# Altium footprint library Shield_v31.PcbLib: 24 footprints (part 1 of 2)
Each footprint in its own frame and in the unit in brackets; x right, y up, seen from the top. Pads: shape width x height; smd on the part's side, far side on the other; paste and mask are expansions set on the pad; w line width, h text height; cw(c..) or ccw(c..) is an arc to the next point about the centre after c.
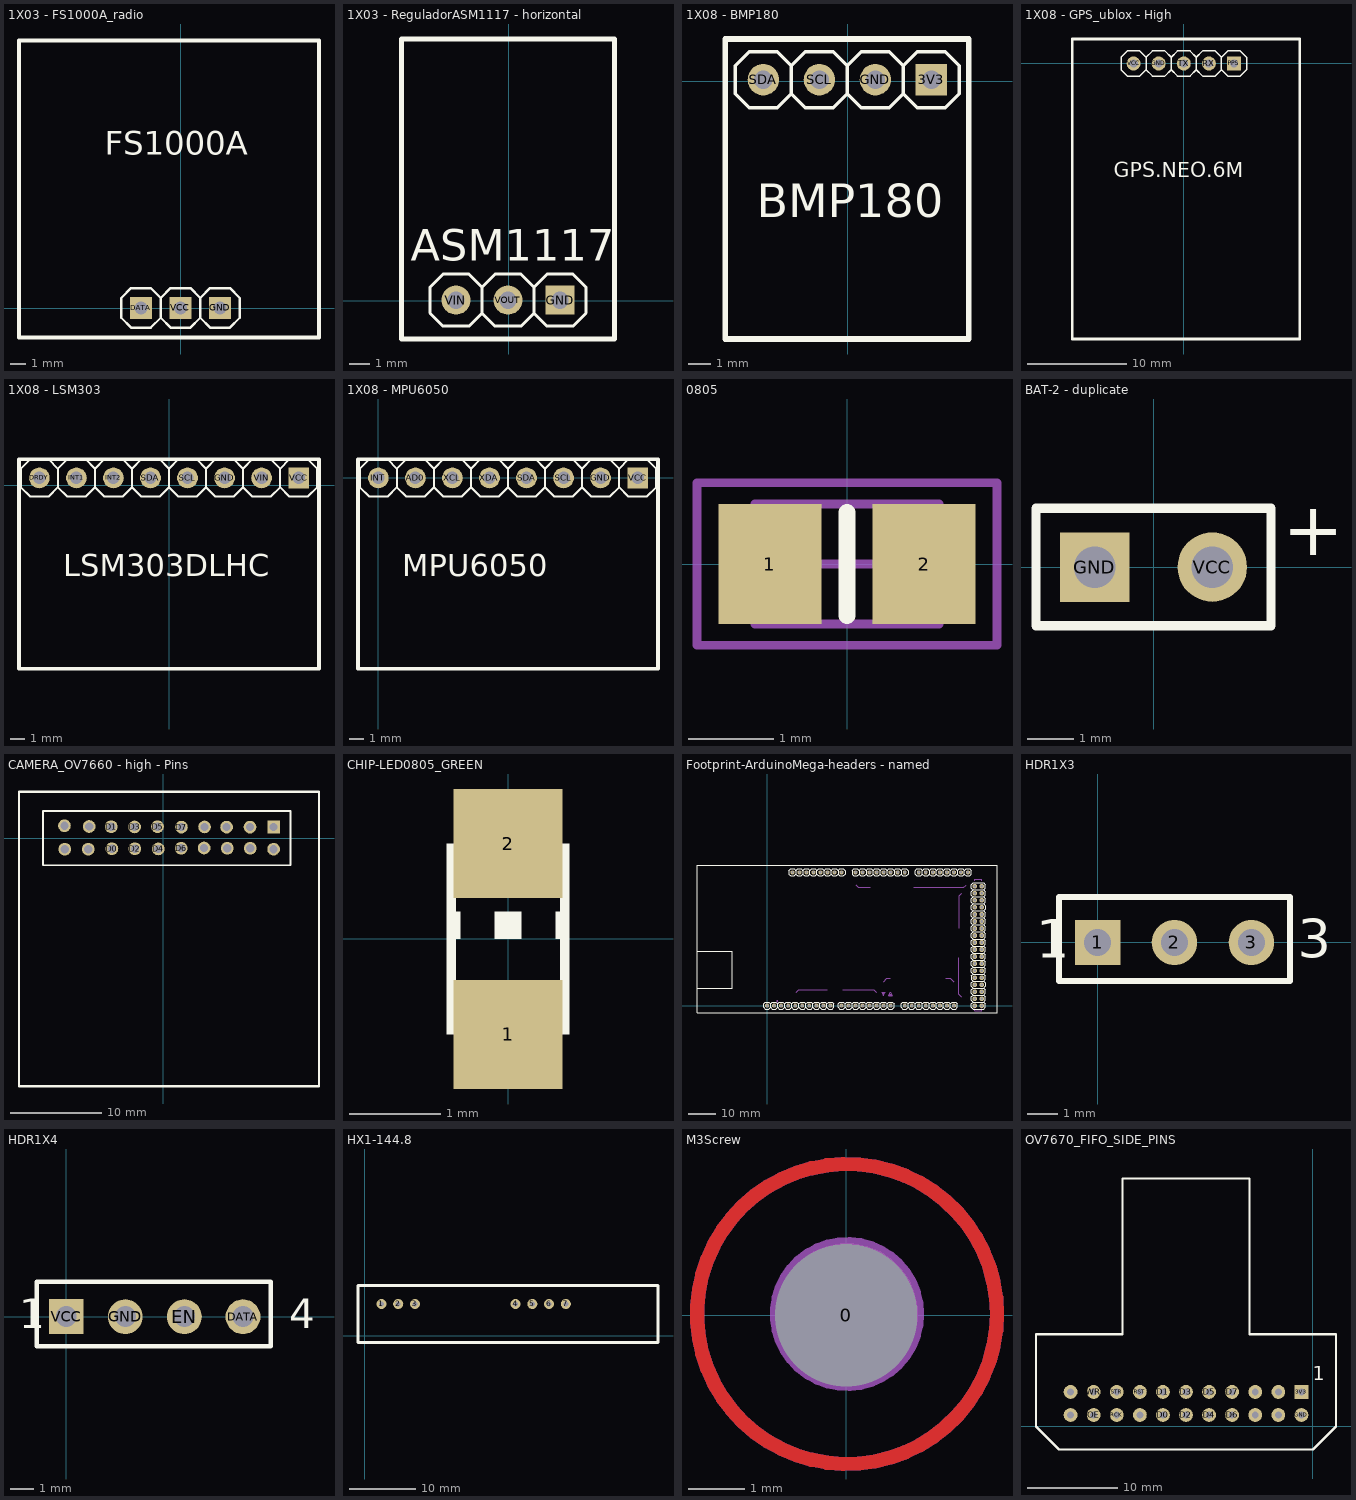
[diagram p0: the footprints below, top view; thin cyan lines are the x and y axes]

## 1X03 - FS1000A_radio [mm]
height 0.55
pads (3):
  rect 1.422x1.422 hole 0.85: DATA(-2.565,0.025) GND(2.515,0.025) VCC(-0.025,0.025)
Top Overlay:
  rectangle: 2.261,-0.229 2.769,0.279
  rectangle: -2.819,-0.229 -2.311,0.279
  rectangle: -0.279,-0.229 0.229,0.279
  lines w0.152: -1.295,-0.61 -0.66,-1.245 0.61,-1.245 1.245,-0.61 ; -1.295,-0.61 -1.93,-1.245 -3.2,-1.245 -3.835,-0.61 -3.835,0.66 -3.2,1.295 -1.93,1.295 -1.295,0.66 ; -1.295,-0.61 -1.295,0.66 ; -1.295,0.66 -0.66,1.295 0.61,1.295 1.245,0.66 ; 1.245,-0.61 1.88,-1.245 3.15,-1.245 3.785,-0.61 3.785,0.66 3.15,1.295 1.88,1.295 1.245,0.66 ; 1.245,-0.61 1.245,0.66
  lines w0.254: -10.4,-1.873 -3.019,-1.873 2.494,-1.873 8.875,-1.873 8.875,17.2 -10.4,17.2 -10.4,-1.873
  text "FS1000A" at -4.9,9.85 h1.52
3D body "FS1000A_module_radio.STEP": height 11.22, standoff -5.8, extent -10.675,-2.475 9.325,17.525

## 1X03 - ReguladorASM1117 - horizontal [mm]
height 0.55
pads (3):
  rect 1.422x1.422 hole 0.85: GND(2.515,0.025)
  round 1.422 hole 0.85: VIN(-2.565,0.025) VOUT(-0.025,0.025)
Top Overlay:
  rectangle: 2.261,-0.229 2.769,0.279
  rectangle: -2.819,-0.229 -2.311,0.279
  rectangle: -0.279,-0.229 0.229,0.279
  lines w0.152: -1.295,-0.61 -0.66,-1.245 0.61,-1.245 1.245,-0.61 ; -1.295,-0.61 -1.93,-1.245 -3.2,-1.245 -3.835,-0.61 -3.835,0.66 -3.2,1.295 -1.93,1.295 -1.295,0.66 ; -1.295,-0.61 -1.295,0.66 ; -1.295,0.66 -0.66,1.295 0.61,1.295 1.245,0.66 ; 1.245,-0.61 1.88,-1.245 3.15,-1.245 3.785,-0.61 3.785,0.66 3.15,1.295 1.88,1.295 1.245,0.66 ; 1.245,-0.61 1.245,0.66
  lines w0.254: -5.225,-1.873 -3.019,-1.873 2.494,-1.873 5.175,-1.873 5.175,12.775 -5.225,12.775 -5.225,-1.873
  text "ASM1117" at -4.775,1.95 h1.52
3D body "final_board_horizontal.STEP": height 6.06, standoff -5.48, extent -5,-1.45 5,12.55

## 1X08 - BMP180 [mil]
height 21.65
pads (4):
  rect 56x56 hole 33.46: 3V3(149.21,2.28)
  round 56 hole 33.46: GND(49.21,2.28) SCL(-50.79,2.28) SDA(-150.79,2.28)
Top Overlay:
  rectangle: 39.21,-7.72 59.21,12.28
  rectangle: -60.79,-7.72 -40.79,12.28
  rectangle: 139.21,-7.72 159.21,12.28
  rectangle: -160.79,-7.72 -140.79,12.28
  lines w6: -100.79,-22.72 -75.79,-47.72 -25.79,-47.72 -0.79,-22.72 ; -100.79,-22.72 -100.79,27.28 ; -100.79,-22.72 -125.79,-47.72 -175.79,-47.72 -200.79,-22.72 -200.79,27.28 -175.79,52.28 -125.79,52.28 -100.79,27.28 ; -100.79,27.28 -75.79,52.28 -25.79,52.28 -0.79,27.28 ; -0.79,-22.72 -0.79,27.28 ; -0.79,-22.72 24.21,-47.72 74.21,-47.72 99.21,-22.72 ; -0.79,27.28 24.21,52.28 74.21,52.28 99.21,27.28 ; 99.21,-22.72 99.21,27.28 ; 99.21,-22.72 124.21,-47.72 174.21,-47.72 199.21,-22.72 199.21,27.28 174.21,52.28 124.21,52.28 99.21,27.28
  lines w10: -218.5,-460.55 -218.5,75 215.55,75 215.55,-460.55 104.08,-460.55 -112.94,-460.55 -218.5,-460.55
  text "BMP180" at -162.4,-243.11 h60
3D body "BMP_180_final.STEP": height 298.21, standoff -262.42, extent -205.71,-446.85 207.68,64.96

## 1X08 - GPS_ublox - High [mil]
height 21.65
pads (5):
  round 56 hole 33.46: GND(-100,0) RX(100,0) TX(0,0) VCC(-200,0)
  rect 56x56 hole 33.46: PPS(200,0)
Top Overlay:
  rectangle: 190,-10 210,10
  rectangle: -210,-10 -190,10
  rectangle: -110,-10 -90,10
  rectangle: -10,-10 10,10
  rectangle: 90,-10 110,10
  lines w6: -150,-25 -125,-50 -75,-50 -50,-25 ; -150,-25 -175,-50 -225,-50 -250,-25 -250,25 -225,50 -175,50 -150,25 ; -150,-25 -150,25 ; -150,25 -125,50 -75,50 -50,25 ; -50,-25 -50,25 ; -50,-25 -25,-50 25,-50 50,-25 ; -50,25 -25,50 25,50 50,25 ; 50,-25 75,-50 125,-50 150,-25 ; 50,-25 50,25 ; 50,25 75,50 125,50 150,25 ; 150,-25 175,-50 225,-50 250,-25 250,25 225,50 175,50 150,25 ; 150,-25 150,25
  lines w10: -443.9,-1097.44 461.61,-1097.44 461.61,97.44 -443.9,97.44 -443.9,-1097.44
  text "GPS.NEO.6M" at -279.53,-453.74 h60
3D body "GPS_ublox_high_pins.STEP": height 456.47, standoff -87.95, extent -448.82,-1109.25 468.5,101.38

## 1X08 - LSM303 [mil]
height 21.65
pads (8):
  round 56 hole 33.46: DRDY(-350,20) GND(150,20) INT1(-250,20) INT2(-150,20) SCL(50,20) SDA(-50,20) VIN(250,20)
  rect 56x56 hole 33.46: VCC(350,20)
Top Overlay:
  rectangle: 340.01,10 360.01,30
  rectangle: -359.99,10 -339.99,30
  rectangle: -259.99,10 -239.99,30
  rectangle: -159.99,10 -139.99,30
  rectangle: -59.99,10 -39.99,30
  rectangle: 40.01,10 60.01,30
  rectangle: 140.01,10 160.01,30
  rectangle: 240.01,10 260.01,30
  lines w6: -300,-5 -275,-30 -225,-30 -200,-5 ; -300,-5 -325,-30 -375,-30 -400,-5 -400,45 -375,70 -325,70 -300,45 ; -300,-5 -300,45 ; -300,45 -275,70 -225,70 -200,45 ; -200,-5 -200,45 ; -200,-5 -175,-30 -125,-30 -100,-5 ; -200,45 -175,70 -125,70 -100,45 ; -100,-5 -75,-30 -25,-30 0,-5 ; -100,-5 -100,45 ; -100,45 -75,70 -25,70 0,45 ; 0,-5 25,-30 75,-30 100,-5 ; 0,-5 0,45 ; 0,45 25,70 75,70 100,45 ; 100,-5 100,45 ; 100,-5 125,-30 175,-30 200,-5 ; 100,45 125,70 175,70 200,45 ; 200,-5 225,-30 275,-30 300,-5 ; 200,-5 200,45 ; 200,45 225,70 275,70 300,45 ; 300,-5 325,-30 375,-30 400,-5 400,45 375,70 325,70 300,45 ; 300,-5 300,45
  lines w10: -405,-495 405,-495 405,70 -405,70 -405,-495
  text "LSM303DLHC" at -285,-245 h60
3D body "sensor2_8pins_azul.step": height 276.7, standoff -177.63, extent -404.9,-491.8 400.1,79.2

## 1X08 - MPU6050 [mil]
height 21.65
pads (8):
  round 56 hole 33.46: AD0(100,0) GND(600,0) INT(0,0) SCL(500,0) SDA(400,0) XCL(200,0) XDA(300,0)
  rect 56x56 hole 33.46: VCC(700,0)
Top Overlay:
  rectangle: 590,-10 610,10
  rectangle: 490,-10 510,10
  rectangle: 390,-10 410,10
  rectangle: 290,-10 310,10
  rectangle: 190,-10 210,10
  rectangle: 90,-10 110,10
  rectangle: -10,-10 10,10
  rectangle: 690,-10 710,10
  lines w6: 50,-25 50,25 ; 50,-25 25,-50 -25,-50 -50,-25 -50,25 -25,50 25,50 50,25 ; 50,-25 75,-50 125,-50 150,-25 ; 50,25 75,50 125,50 150,25 ; 150,-25 175,-50 225,-50 250,-25 ; 150,-25 150,25 ; 150,25 175,50 225,50 250,25 ; 250,-25 250,25 ; 250,-25 275,-50 325,-50 350,-25 ; 250,25 275,50 325,50 350,25 ; 350,-25 350,25 ; 350,-25 375,-50 425,-50 450,-25 ; 350,25 375,50 425,50 450,25 ; 450,-25 475,-50 525,-50 550,-25 ; 450,-25 450,25 ; 450,25 475,50 525,50 550,25 ; 550,-25 550,25 ; 550,-25 575,-50 625,-50 650,-25 ; 550,25 575,50 625,50 650,25 ; 650,-25 650,25 ; 650,-25 675,-50 725,-50 750,-25 750,25 725,50 675,50 650,25
  lines w10: -55,-515 -55,50 755,50 755,-515 -55,-515
  text "MPU6050" at 65,-265 h60
3D body "User Library-GY-521.STEP": height 266.5, standoff -198.85, extent -44.09,-553.27 755.9,46.93

## 0805 [mm]
height 4.3
pads (2):
  rect 1.2x1.4 smd: 1(-0.9,0) 2(0.9,0)
Top Overlay:
  lines w0.2: 0,-0.6 0,0.6
Mechanical 13:
  lines w0.1: -1.075,-0.7 -1.075,0.7 1.075,0.7 1.075,-0.7 -1.075,-0.7
Mechanical 15:
  lines w0.1: -0.5,0 0.5,0 ; 0,-0.5 0,0.5 ; -1.75,-0.95 -1.75,0.95 1.75,0.95 1.75,-0.95 -1.75,-0.95
3D body "SW3dPS-0805 SMD Capacitor.STEP": height 0.78, standoff 0, extent -1,-0.625 1,0.625

## BAT-2 - duplicate [mm] "Battery; 2 Leads"
height 0.55
pads (2):
  rect 1.5x1.5 hole 0.9: GND(-1.27,0)
  round 1.5 hole 0.9: VCC(1.27,0)
Top Overlay:
  lines w0.2: -2.54,-1.27 -2.54,1.27 2.54,1.27 2.54,-1.27 -2.54,-1.27
  text "+" at 2.794,0.254 h1.15
3D body "Batarya.STEP": height 5.08, standoff 1.08, extent -6.8,-51.9 27.2,-1.9

## CAMERA_OV7660 - high - Pins [mm] "Connector; Header; 3x2 Position"
height 0.55
pads (20):
  rect 1.4x1.4 hole 0.9: 3V3(12.15,1.225)
  round 1.4 hole 0.9: D0(-5.65,-1.175) D1(-5.725,1.25) D2(-3.125,-1.175) D3(-3.15,1.225) D4(-0.55,-1.2) D5(-0.625,1.25) D6(1.975,-1.125) D7(2,1.2) GND(12.15,-1.225) HREF(7.05,-1.125) PCLK(4.55,1.225) PWDN(-8.15,1.275) RSV1(-8.25,-1.225) RSV2(-10.875,1.35) RSV3(-10.835,-1.225) SCL(9.55,1.2) SDA(9.575,-1.125) VSYNC(6.975,1.2) XCLK(4.5,-1.1)
Top Overlay:
  lines w0.2: -13.248,-3.003 14.025,-3.003 14.025,2.966 -13.248,2.966 -13.248,-3.003
  lines w0.254: -15.875,-27.305 -15.875,5.08 -15.24,5.08 17.145,5.08 17.145,-27.305 -15.875,-27.305
3D body "camara_high_pins.STEP": height 30.69, standoff -1.31, extent -15.2,-26.95 16.8,5.05

## CHIP-LED0805_GREEN [mm]
height 0.55
pads (2):
  rect 1.2x1.2 smd: 1(0,-1.05) 2(0,1.05)
Top Overlay:
  rectangle: -0.675,-1.05 0.675,-0.45
  rectangle: -0.675,0.45 0.675,1.05
  rectangle: -0.15,0 0.15,0.3
  rectangle: 0.525,0 0.675,0.3
  rectangle: -0.675,0 -0.525,0.3
  lines w0.102: -0.625,-0.45 -0.625,0.45 ; 0.625,-0.475 0.625,0.45
3D body "User Library-led_0805_green.step": height 1.1, standoff 0, extent -0.625,-1.01 0.625,1.01

## Footprint-ArduinoMega-headers - named [mil]
height 10
pads (86):
  oct 56x56 hole 33.46: 3V3(660,1900) 5V_TL(760,1900) A0(1260,1900) A1(1360,1900) A2(1460,1900) A3(1560,1900) A4(1660,1900) A5(1760,1900) A6(1860,1900) A7(1960,1900) A8(2160,1900) A9(2260,1900) A10(2360,1900) A11(2460,1900) A12(2560,1900) A13(2660,1900) A14(2760,1900) A15(2860,1900) AREF(200,0) D0(1760,0) D1(1660,0) D2(1560,0) D3(1460,0) D4(1360,0) D5(1260,0) D6(1160,0) D7(1060,0) D8(900,0) D9(800,0) D10(700,0) D11(600,0) D12(500,0) D13(400,0) D14(1960,0) D15(2060,0) D16(2160,0) D17(2260,0) D18(2360,0) D19(2460,0) D20(2560,0) D21(2660,0) EMPTY(360,1900) GND_TLB(960,1900) GND_TLT(860,1900) GND_TR(300,0) IOREF(460,1900) RESET(560,1900) SCL(0,0) SDA(100,0) VIN(1060,1900)
  oct 66x66 hole 37.4: 5V_BB(3060,0) 5V_BT(2960,0) D22(2960,100) D23(3060,100) D24(2960,200) D25(3060,200) D26(2960,300) D27(3060,300) D28(2960,400) D29(3060,400) D30(2960,500) D31(3060,500) D32(2960,600) D33(3060,600) D34(2960,700) D35(3060,700) D36(2960,800) D37(3060,800) D38(2960,900) D39(3060,900) D40(2960,1000) D41(3060,1000) D42(2960,1100) D43(3060,1100) D44(2960,1200) D45(3060,1200) D46(2960,1300) D47(3060,1300) D48(2960,1400) D49(3060,1400) D50(2960,1500) D51(3060,1500) D52(2960,1600) D53(3060,1600) GND_BB(3060,1700) GND_BT(2960,1700)
Top Overlay:
  drawing of 540 lines, arcs and shapes, not listed
Bottom Overlay:
  region: 2970,1690 2970,1710 2950,1710 2950,1690
  region: 3070,1690 3070,1710 3050,1710 3050,1690
  region: 2970,1590 2970,1610 2950,1610 2950,1590
  region: 3070,1590 3070,1610 3050,1610 3050,1590
  region: 2970,1490 2970,1510 2950,1510 2950,1490
  region: 3070,1490 3070,1510 3050,1510 3050,1490
  region: 2970,1390 2970,1410 2950,1410 2950,1390
  region: 3070,1390 3070,1410 3050,1410 3050,1390
  region: 2970,1290 2970,1310 2950,1310 2950,1290
  region: 3070,1290 3070,1310 3050,1310 3050,1290
  region: 2970,1190 2970,1210 2950,1210 2950,1190
  region: 3070,1190 3070,1210 3050,1210 3050,1190
  region: 2970,1090 2970,1110 2950,1110 2950,1090
  region: 3070,1090 3070,1110 3050,1110 3050,1090
  region: 2970,990 2970,1010 2950,1010 2950,990
  region: 3070,990 3070,1010 3050,1010 3050,990
  region: 2970,890 2970,910 2950,910 2950,890
  region: 3070,890 3070,910 3050,910 3050,890
  region: 2970,790 2970,810 2950,810 2950,790
  region: 3070,790 3070,810 3050,810 3050,790
  region: 2970,690 2970,710 2950,710 2950,690
  region: 3070,690 3070,710 3050,710 3050,690
  region: 2970,590 2970,610 2950,610 2950,590
  region: 3070,590 3070,610 3050,610 3050,590
  region: 2970,490 2970,510 2950,510 2950,490
  region: 2970,390 2970,410 2950,410 2950,390
  region: 2970,290 2970,310 2950,310 2950,290
  region: 3070,490 3070,510 3050,510 3050,490
  region: 3070,390 3070,410 3050,410 3050,390
  region: 3070,290 3070,310 3050,310 3050,290
  region: 2970,190 2970,210 2950,210 2950,190
  region: 3070,190 3070,210 3050,210 3050,190
  region: 2970,90 2970,110 2950,110 2950,90
  region: 3070,90 3070,110 3050,110 3050,90
  region: 3070,-10 3070,10 3050,10 3050,-10
  region: 2970,-10 2970,10 2950,10 2950,-10
Mechanical 8:
  circle w12: c142.77,63 r7.07
  lines w12: 412,194 447,229 857,229 ; 1077,229 1517,229 1557,189 ; 1262,1724 1297.23,1688.77 1471.54,1688.77 ; 1662,344 1707,389 1757,389 ; 2086.54,1684 2802,1684 2837,1719 ; 2542,389 2612,389 2657,344 ; 2731.84,684 2731.84,164.16 2767.42,128.58 ; 2735.84,1105 2735.84,1565 2771.84,1601 ; 2957,-46 2957,-71 3057,-71 3057,-46 ; 2957,1779 2957,1799 3057,1799 3057,1779
  lines w16: 1632,189 1657,164 ; 1632,189 1657,189 ; 1632,189 1657,139 1682,189 ; 1657,164 1682,189 ; 1657,164 1657,189 ; 1657,189 1682,189 ; 1732,139 1757,164 ; 1732,139 1757,189 1782,139 ; 1732,139 1757,139 ; 1757,139 1782,139 ; 1757,139 1757,164 ; 1757,164 1782,139
  text "SDA" at 125.54,75.77 h56
  text "SCL" at 22.84,81 h56
  text "PWM" at 879.84,198 h66
  text "15" at 2085,75 h56
  text "36" at 2795,776 h56
  text "13" at 429,83 h56
  text "12" at 529,83 h56
  text "GND" at 328.84,78 h56
  text "AREF" at 223.84,79 h56
  text "IOREF" at 483.84,1660 h40
  text "DIGITAL" at 2765.84,705 h66
  text "52" at 2795,1576 h56
  text "53" at 3129.84,1576 h56
  text "48" at 2795,1376 h56
  text "50" at 2795,1476 h56
  text "46" at 2795,1276 h56
  text "44" at 2795,1176 h56
  text "51" at 3137,1473 h56
  text "49" at 3137,1373 h56
  text "47" at 3137,1278 h56
  text "45" at 3137,1178 h56
  text "42" at 2795,1076 h56
  text "43" at 3137,1078 h56
  text "40" at 2795,976 h56
  text "41" at 3137,978 h56
  text "39" at 3137,878 h56
  text "38" at 2795,876 h56
  text "37" at 3137,778 h56
  text "35" at 3137,678 h56
  text "34" at 2795,676 h56
  text "33" at 3137,578 h56
  text "32" at 2795,576 h56
  text "31" at 3137,478 h56
  text "30" at 2795,476 h56
  text "28" at 2795,376 h56
  text "26" at 2795,276 h56
  text "24" at 2795,176 h56
  text "22" at 2795,76 h56
  text "GND" at 3098.84,1779 h56
  text "5V" at 2856.84,-105 h44
  text "21" at 2685,75 h56
  text "20" at 2585,75 h56
  text "19" at 2485,75 h56
  text "18" at 2385,75 h56
  text "17" at 2285,75 h56
  text "16" at 2185,75 h56
  text "14" at 1982,76 h56
  text "TX1" at 2385,190 h56
  text "RX1" at 2485,190 h56
  text "TX3" at 1983.84,191 h56
  text "RX3" at 2085,190 h56
  text "RX2" at 2285,190 h56
  text "TX2" at 2185,190 h56
  text "15" at 2880.84,1763 h40
  text "14" at 2780.84,1764 h40
  text "13" at 2680.84,1763 h40
  text "12" at 2581.84,1763 h40
  text "11" at 2477.84,1782 h40
  text "10" at 2381.84,1766 h40
  text "9" at 2279.84,1798 h40
  text "8" at 2176.84,1800 h40
  text "SCL" at 2685,190 h56
  text "SDA" at 2585,190 h56
  text "7" at 1982,1805 h40
  text "6" at 1877,1805 h40
  text "5" at 1777,1805 h40
  text "4" at 1682,1805 h40
  text "3" at 1582,1805 h40
  text "2" at 1482,1805 h40
  text "1" at 1375.84,1822 h40
  text "0" at 1282,1805 h40
  text "11" at 629,83 h56
  text "10" at 729,83 h56
  text "9" at 836,82 h56
  text "8" at 936,82 h56
  text "7" at 1086,82 h56
  text "6" at 1186,82 h56
  text "5" at 1286,82 h56
  text "4" at 1386,82 h56
  text "3" at 1486,82 h56
  text "2" at 1586,82 h56
  text "1" at 1685.84,88 h56
  text "0" at 1782,114 h56
  text "GND" at 854.84,1787 h40
  text "VIN" at 1008.84,1793 h40
  text "5V" at 731.84,1790 h40
  text "3V3" at 679.84,1728 h40
  text "RESET" at 580.84,1651 h40
  text "RX" at 1783.84,211 h56
  text "TX" at 1683.84,212 h56
  text "ANALOG IN" at 1432.84,1663 h66
  text "23" at 3137,80 h56
  text "25" at 3137,180 h56
  text "27" at 3137,280 h56
  text "29" at 3137,380 h56
3D body "User Library-Header_Male_10Pin.STEP": height 88.11, standoff -366.22, extent -50,-49.01 950,49.01
3D body "User Library-arduino_MEGA2650-1.STEP": height 620.35, standoff 19.96, extent -988,-98 3262,2002
3D body "User Library-Header_Male_8Pin.STEP": height 88.11, standoff -366.22, extent 1010,-49.03 1810,49
3D body "User Library-Header_Male_8Pin.STEP": height 351.22, standoff -103.11, extent 1910,-49.03 2710,49
3D body "User Library-Header_Male_8Pin.STEP": height 356.22, standoff -98.11, extent 1210,1850.97 2010,1949
3D body "User Library-Header_Male_8Pin.STEP": height 356.22, standoff -98.11, extent 2110,1850.97 2910,1949
3D body "User Library-Header_Male_8Pin.STEP": height 351.22, standoff -103.11, extent 310,1850.97 1110,1949
3D body "pin_header_awl254-dg-g36d.stp": height 88.11, standoff -364.65, extent 2910,-50 3110,1750

## HDR1X3 [mm] "Connector; Header; 3x2 Position"
height 0.55
pads (3):
  rect 1.5x1.5 hole 0.9: 1(0,0)
  round 1.5 hole 0.9: 2(2.54,0) 3(5.08,0)
Top Overlay:
  lines w0.2: 1.482,-1.27 6.35,-1.27 ; 6.35,-1.27 -1.27,-1.27 -1.27,1.5 6.35,1.5 6.35,-1.27
  text "1" at -2.032,-0.508 h1.27
  text "3" at 6.604,-0.508 h1.27
3D body "3_pines.STEP": height 9.58, standoff -1.96, extent -1.31,-1.19 6.31,1.3

## HDR1X4 [mm] "Connector; Header; 3x2 Position"
height 0.55
pads (4):
  round 1.5 hole 0.9: DATA(7.6,0) EN(5.08,0) GND(2.54,0)
  rect 1.5x1.5 hole 0.9: VCC(0,0)
Top Overlay:
  lines w0.2: 1.482,-1.27 8.8,-1.27 8.8,1.5 -1.27,1.5 -1.27,-1.27 6.35,-1.27
  text "1" at -2.032,-0.508 h1.27
  text "4" at 9.6,-0.5 h1.27
3D body "4_pines.STEP": height 9.1, standoff -2.44, extent -1.28,-1.19 8.88,1.3

## HX1-144.8 [mil]
pads (7):
  round 60 hole 30: 1(100,190) 2(200,190) 3(300,190) 4(900,190) 5(1000,190) 6(1100,190) 7(1200,190)
Top Overlay:
  lines w20: -40,-40 -40,300 100,300 1750,300 1750,250 1750,-40 -40,-40
3D body "hx1-144.800.STEP": height 570.87, standoff -393.7, extent 0,4.73 1692.92,201.58

## M3Screw [mil]
height 21.65
pads (1):
  round 60 hole 100.22: 0(0,0)
Top Layer:
  circle w10: c0.46,1 r105.39
Bottom Layer:
  circle w10: c0.46,1 r105.39
Keep-Out Layer:
  board cut-out: -48.75,1 -48.75,-3.85 -46.86,-13.35 -43.15,-22.31 -37.76,-30.37 -30.91,-37.23 -22.85,-42.61 -13.89,-46.32 -4.38,-48.21 0.46,-48.21 5.31,-48.21 14.82,-46.32 23.77,-42.61 31.83,-37.23 38.69,-30.37 44.07,-22.31 47.78,-13.35 49.68,-3.85 49.68,1 49.68,5.85 47.78,15.35 44.07,24.31 38.69,32.37 31.83,39.23 23.77,44.61 14.82,48.32 5.31,50.21 0.46,50.21 -4.38,50.21 -13.89,48.32 -22.85,44.61 -30.91,39.23 -37.76,32.37 -43.15,24.31 -46.86,15.35 -48.75,5.85
Mechanical 3:
  circle w10: c0.46,1 r49.21
3D body "opresor (1_4-20)x1.STEP": height 15.75, standoff -984.25, extent -125,-125 125,125

## OV7670_FIFO_SIDE_PINS [mil]
height 21.65
pads (22):
  rect 60x60 hole 30: 3V3(-50,150)
  round 60 hole 30: D0(-650,50) D1(-650,150) D2(-550,50) D3(-550,150) D4(-450,50) D5(-450,150) D6(-350,50) D7(-350,150) GND(-50,50) HREF(-250,50) OE(-950,50) PWDN(-750,50) RCK(-850,50) RRST(-1050,50) RST(-750,150) SIOC(-150,150) SIOD(-150,50) STR(-850,150) VSYNC(-250,150) WR(-950,150) WRST(-1050,150)
Top Overlay:
  lines w10: -1200,0 -1200,300 -1200,400 -825,400 -825,1075 -275,1075 -275,400 100,400 100,300 100,0 0,-100 -1100,-100 -1200,0
  text "1" at 0,200 h60
3D body "2x11.STEP": height 384.71, standoff -135.31, extent -1100,0 0,318.65
3D body "User Library-Sparkfun CMOS Camera Module.STEP": height 1417.32, standoff 157.48, extent -1179.92,210.63 79.92,1076.77